# Altium footprint library WR-TBL_Rising Cage Clamp.PcbLib: 435 footprints (part 11 of 28)
Each footprint in its own frame and in the unit in brackets; x right, y up, seen from the top. Pads: shape width x height; smd on the part's side, far side on the other; paste and mask are expansions set on the pad; w line width, h text height; cw(c..) or ccw(c..) is an arc to the next point about the centre after c.
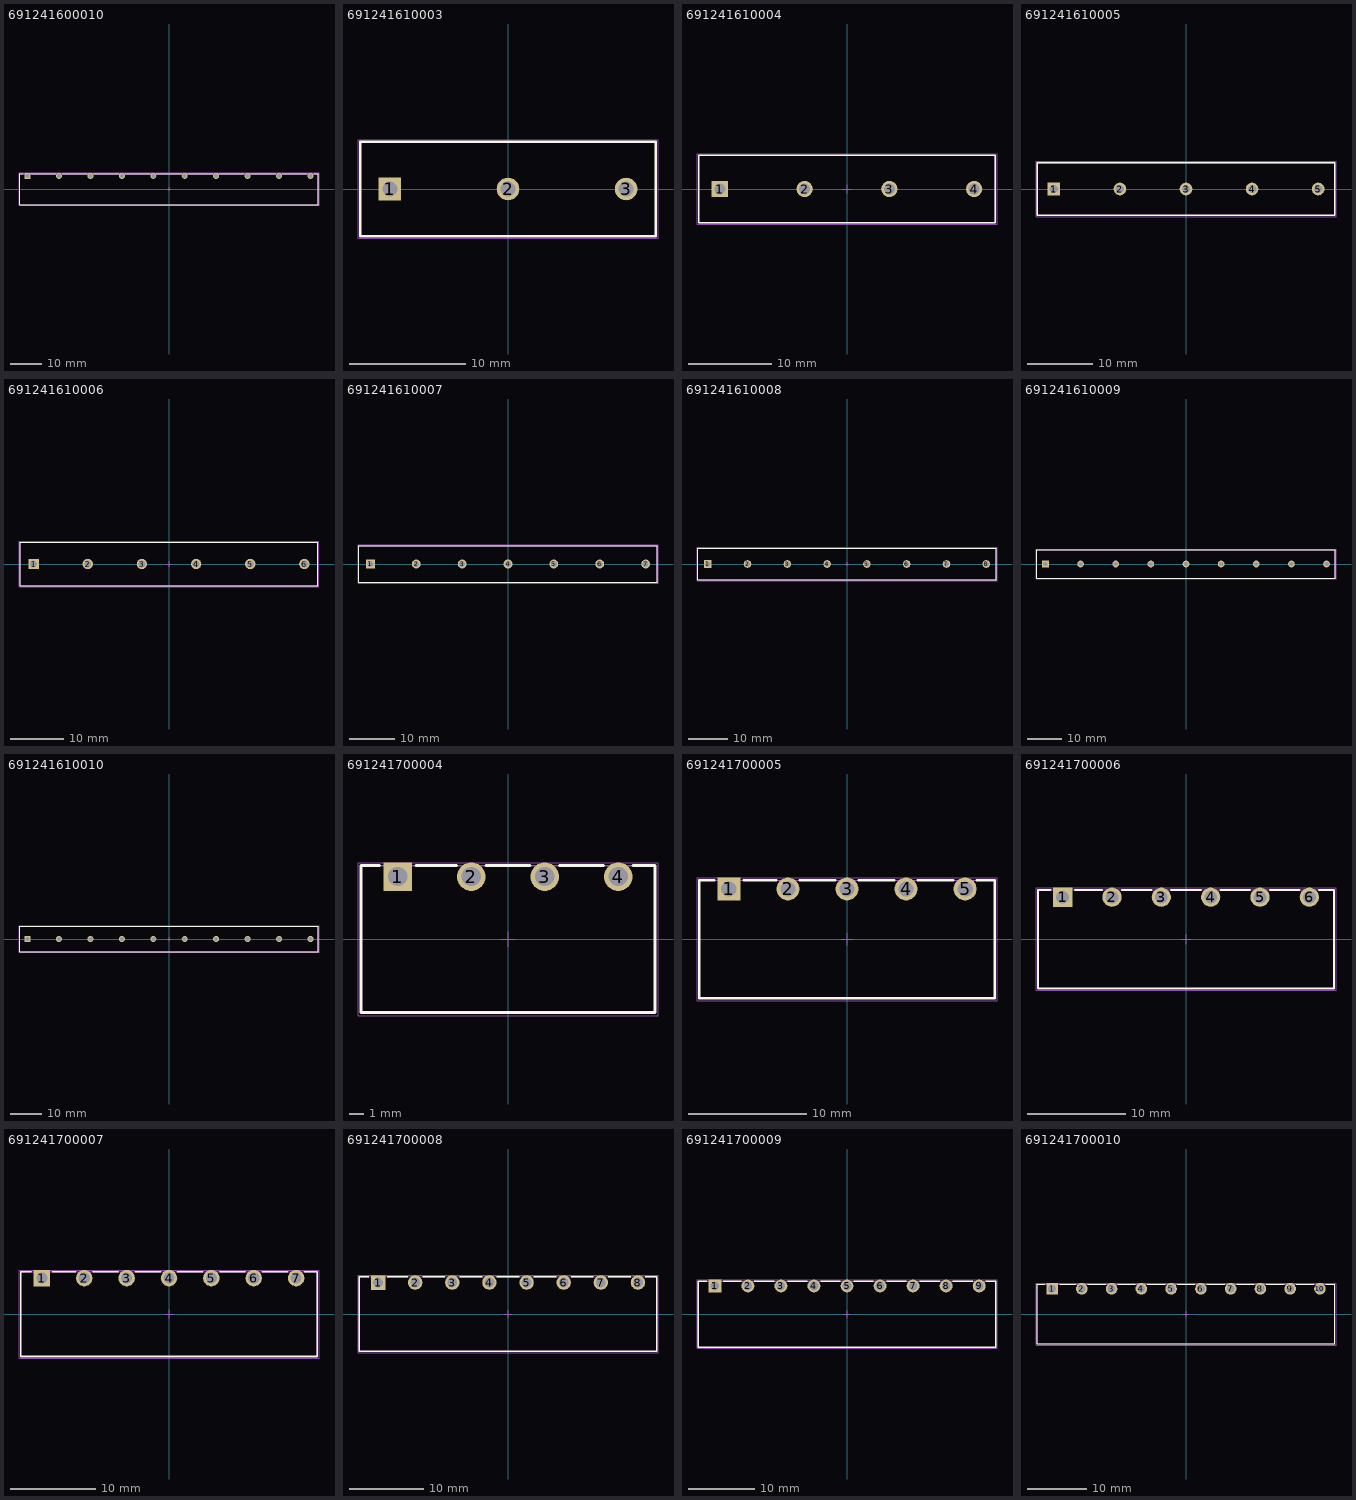
[diagram p10: the footprints below, top view; thin cyan lines are the x and y axes]

## 691241600010 [mm] "Vertical Cable Entry with Rising Cage Clamp, pitch 10.16mm, 10p"
height 8.1
pads (10):
  rect 1.95x1.95 hole 1.3: 1(-45.72,4.25)
  round 1.95 hole 1.3: 2(-35.56,4.25) 3(-25.4,4.25) 4(-15.24,4.25) 5(-5.08,4.25) 6(5.08,4.25) 7(15.24,4.25) 8(25.4,4.25) 9(35.56,4.25) 10(45.72,4.25)
Top Overlay:
  lines w0.2: -47.01,5 -48.26,5 -48.26,-5 48.26,-5 48.26,5 46.76,5 ; -44.46,5 -36.56,5 ; -34.56,5 -26.41,5 ; -24.4,5 -16.25,5 ; -14.24,5 -6.09,5 ; -4.08,5 4.07,5 ; 6.08,5 14.23,5 ; 16.24,5 24.39,5 ; 26.4,5 34.55,5 ; 36.56,5 44.71,5
Mechanical 13:
  lines w0.1: -48.26,-5 48.26,-5 48.26,5 -48.26,5 -48.26,-5
Mechanical 15:
  lines w0.05: -0.5,0 0.5,0 ; 0,-0.5 0,0.5 ; -48.46,-5.2 48.46,-5.2 48.46,5.2 -48.46,5.2 -48.46,-5.2
3D body "691241600010.stp": height 8.2, standoff -3.4, extent -48.26,-5 48.26,5

## 691241610003 [mm] "10.16mm Horizontal Cable Entry with Rising Cage Clamp, 03p"
height 10
pads (3):
  rect 1.95x1.95 hole 1.3: 1(-10.16,0)
  round 1.95 hole 1.3: 2(0,0) 3(10.16,0)
Top Overlay:
  lines w0.2: -12.7,-4.05 -12.7,4.05 12.7,4.05 12.7,-4.05 -12.7,-4.05
Mechanical 13:
  lines w0.1: -12.7,-4.05 12.7,-4.05 12.7,4.05 -12.7,4.05 -12.7,-4.05
Mechanical 15:
  lines w0.05: -0.5,0 0.5,0 ; 0,-0.5 0,0.5 ; -12.9,-4.25 12.9,-4.25 12.9,4.25 -12.9,4.25 -12.9,-4.25
3D body "691241610003.stp": height 10.1, standoff -3.4, extent -12.7,-4.05 12.7,4.05

## 691241610004 [mm] "10.16mm Horizontal Cable Entry with Rising Cage Clamp, 04p"
height 10
pads (4):
  rect 1.95x1.95 hole 1.3: 1(-15.24,0)
  round 1.95 hole 1.3: 2(-5.08,0) 3(5.08,0) 4(15.24,0)
Top Overlay:
  lines w0.2: -17.78,-4.05 -17.78,4.05 17.78,4.05 17.78,-4.05 -17.78,-4.05
Mechanical 13:
  lines w0.1: -17.78,-4.05 17.78,-4.05 17.78,4.05 -17.78,4.05 -17.78,-4.05
Mechanical 15:
  lines w0.05: -0.5,0 0.5,0 ; 0,-0.5 0,0.5 ; -17.98,-4.25 17.98,-4.25 17.98,4.25 -17.98,4.25 -17.98,-4.25
3D body "691241610004.stp": height 10.1, standoff -3.4, extent -17.78,-4.05 17.78,4.05

## 691241610005 [mm] "10.16mm Horizontal Cable Entry with Rising Cage Clamp, 05p"
height 10
pads (5):
  rect 1.95x1.95 hole 1.3: 1(-20.32,0)
  round 1.95 hole 1.3: 2(-10.16,0) 3(0,0) 4(10.16,0) 5(20.32,0)
Top Overlay:
  lines w0.2: -22.86,-4.05 -22.86,4.05 22.86,4.05 22.86,-4.05 -22.86,-4.05
Mechanical 13:
  lines w0.1: -22.86,-4.05 22.86,-4.05 22.86,4.05 -22.86,4.05 -22.86,-4.05
Mechanical 15:
  lines w0.05: -0.5,0 0.5,0 ; 0,-0.5 0,0.5 ; -23.06,-4.25 23.06,-4.25 23.06,4.25 -23.06,4.25 -23.06,-4.25
3D body "691241610005.stp": height 10.1, standoff -3.4, extent -22.86,-4.05 22.86,4.05

## 691241610006 [mm] "10.16mm Horizontal Cable Entry with Rising Cage Clamp, 06p"
height 10
pads (6):
  rect 1.95x1.95 hole 1.3: 1(-25.4,0)
  round 1.95 hole 1.3: 2(-15.24,0) 3(-5.08,0) 4(5.08,0) 5(15.24,0) 6(25.4,0)
Top Overlay:
  lines w0.2: -27.94,-4.05 27.94,-4.05 27.94,4.05 -27.94,4.05 -27.94,-4.05
Mechanical 13:
  lines w0.1: -27.94,-4.05 -27.94,4.05 27.94,4.05 27.94,-4.05 -27.94,-4.05
Mechanical 15:
  lines w0.05: -0.5,0 0.5,0 ; 0,-0.5 0,0.5 ; -28.14,-4.25 -28.14,4.25 28.14,4.25 28.14,-4.25 -28.14,-4.25
3D body "691241610006.stp": height 10.1, standoff -3.4, extent -27.94,-4.05 27.94,4.05

## 691241610007 [mm] "10.16mm Horizontal Cable Entry with Rising Cage Clamp, 07p"
height 10
pads (7):
  rect 1.95x1.95 hole 1.3: 1(-30.48,0)
  round 1.95 hole 1.3: 2(-20.32,0) 3(-10.16,0) 4(0,0) 5(10.16,0) 6(20.32,0) 7(30.48,0)
Top Overlay:
  lines w0.2: -33.02,-4.05 -33.02,4.05 33.02,4.05 33.02,-4.05 -33.02,-4.05
Mechanical 13:
  lines w0.1: -33.02,-4.05 33.02,-4.05 33.02,4.05 -33.02,4.05 -33.02,-4.05
Mechanical 15:
  lines w0.05: -0.5,0 0.5,0 ; 0,-0.5 0,0.5 ; -33.22,-4.25 33.22,-4.25 33.22,4.25 -33.22,4.25 -33.22,-4.25
3D body "691241610007.stp": height 10.1, standoff -3.4, extent -33.02,-4.05 33.02,4.05

## 691241610008 [mm] "10.16mm Horizontal Cable Entry with Rising Cage Clamp, 08p"
height 10
pads (8):
  rect 1.95x1.95 hole 1.3: 1(-35.56,0)
  round 1.95 hole 1.3: 2(-25.4,0) 3(-15.24,0) 4(-5.08,0) 5(5.08,0) 6(15.24,0) 7(25.4,0) 8(35.56,0)
Top Overlay:
  lines w0.2: -38.1,-4.05 -38.1,4.05 38.1,4.05 38.1,-4.05 -38.1,-4.05
Mechanical 13:
  lines w0.1: -38.1,-4.05 38.1,-4.05 38.1,4.05 -38.1,4.05 -38.1,-4.05
Mechanical 15:
  lines w0.05: -0.5,0 0.5,0 ; 0,-0.5 0,0.5 ; -38.3,-4.25 38.3,-4.25 38.3,4.25 -38.3,4.25 -38.3,-4.25
3D body "691241610008.stp": height 10.1, standoff -3.4, extent -38.1,-4.05 38.1,4.05

## 691241610009 [mm] "10.16mm Horizontal Cable Entry with Rising Cage Clamp, 09p"
height 10
pads (9):
  rect 1.95x1.95 hole 1.3: 1(-40.64,0)
  round 1.95 hole 1.3: 2(-30.48,0) 3(-20.32,0) 4(-10.16,0) 5(0,0) 6(10.16,0) 7(20.32,0) 8(30.48,0) 9(40.64,0)
Top Overlay:
  lines w0.2: -43.18,-4.05 -43.18,4.05 43.18,4.05 43.18,-4.05 -43.18,-4.05
Mechanical 13:
  lines w0.1: -43.18,-4.05 43.18,-4.05 43.18,4.05 -43.18,4.05 -43.18,-4.05
Mechanical 15:
  lines w0.05: -0.5,0 0.5,0 ; 0,-0.5 0,0.5 ; -43.38,-4.25 43.38,-4.25 43.38,4.25 -43.38,4.25 -43.38,-4.25
3D body "691241610009.stp": height 10.1, standoff -3.4, extent -43.18,-4.05 43.18,4.05

## 691241610010 [mm] "10.16mm Horizontal Cable Entry with Rising Cage Clamp, 10p"
height 10
pads (10):
  rect 1.95x1.95 hole 1.3: 1(-45.72,0)
  round 1.95 hole 1.3: 2(-35.56,0) 3(-25.4,0) 4(-15.24,0) 5(-5.08,0) 6(5.08,0) 7(15.24,0) 8(25.4,0) 9(35.56,0) 10(45.72,0)
Top Overlay:
  lines w0.2: -48.26,-4.05 -48.26,4.05 48.26,4.05 48.26,-4.05 -48.26,-4.05
Mechanical 13:
  lines w0.1: -48.26,-4.05 48.26,-4.05 48.26,4.05 -48.26,4.05 -48.26,-4.05
Mechanical 15:
  lines w0.05: -0.5,0 0.5,0 ; 0,-0.5 0,0.5 ; -48.46,-4.25 48.46,-4.25 48.46,4.25 -48.46,4.25 -48.46,-4.25
3D body "691241610010.stp": height 10.1, standoff -3.4, extent -48.26,-4.05 48.26,4.05

## 691241700004 [mm] "Serie 2417-5.00mm Vertical Cable Entry with Rising Cage Clamp, 4 pins"
height 8.1
pads (4):
  rect 1.95x1.95 hole 1.3: 1(-7.5,4.25)
  round 1.95 hole 1.3: 2(-2.5,4.25) 3(2.5,4.25) 4(7.5,4.25)
Top Overlay:
  lines w0.2: -8.75,5 -10,5 -10,-5 10,-5 10,5 8.5,5 ; -6.25,5 -3.5,5 ; -1.5,5 1.5,5 ; 3.5,5 6.5,5
Mechanical 13:
  lines w0.1: -10,-5 -10,5 10,5 10,-5 -10,-5
Mechanical 15:
  lines w0.05: -0.5,0 0.5,0 ; 0,-0.5 0,0.5 ; -10.2,-5.2 -10.2,5.2 10.2,5.2 10.2,-5.2 -10.2,-5.2
3D body "691241700004.stp": height 8.15, standoff -3.45, extent -10,-5 10,5

## 691241700005 [mm] "Serie 2417-5.00mm Vertical Cable Entry with Rising Cage Clamp, 5 pins"
height 8.1
pads (5):
  rect 1.95x1.95 hole 1.3: 1(-10,4.25)
  round 1.95 hole 1.3: 2(-5,4.25) 3(0,4.25) 4(5,4.25) 5(10,4.25)
Top Overlay:
  lines w0.2: -11.25,5 -12.5,5 -12.5,-5 12.5,-5 12.5,5 11,5 ; -8.75,5 -6,5 ; -4,5 -1,5 ; 1,5 4,5 ; 6,5 9,5
Mechanical 13:
  lines w0.1: -12.5,-5 -12.5,5 12.5,5 12.5,-5 -12.5,-5
Mechanical 15:
  lines w0.05: -0.5,0 0.5,0 ; 0,-0.5 0,0.5 ; -12.7,-5.2 -12.7,5.2 12.7,5.2 12.7,-5.2 -12.7,-5.2
3D body "691241700005.stp": height 8.15, standoff -3.45, extent -12.5,-5 12.5,5

## 691241700006 [mm] "Serie 2417-5.00mm Vertical Cable Entry with Rising Cage Clamp, 6 pins"
height 8.1
pads (6):
  rect 1.95x1.95 hole 1.3: 1(-12.5,4.25)
  round 1.95 hole 1.3: 2(-7.5,4.25) 3(-2.5,4.25) 4(2.5,4.25) 5(7.5,4.25) 6(12.5,4.25)
Top Overlay:
  lines w0.2: -13.75,5 -15,5 -15,-5 15,-5 15,5 13.5,5 ; -11.25,5 -8.5,5 ; -6.5,5 -3.5,5 ; -1.5,5 1.5,5 ; 3.5,5 6.5,5 ; 8.5,5 11.5,5
Mechanical 13:
  lines w0.1: -15,-5 15,-5 15,5 -15,5 -15,-5
Mechanical 15:
  lines w0.05: -0.5,0 0.5,0 ; 0,-0.5 0,0.5 ; -15.2,-5.2 15.2,-5.2 15.2,5.2 -15.2,5.2 -15.2,-5.2
3D body "691241700006.stp": height 8.15, standoff -3.45, extent -15,-5 15,5

## 691241700007 [mm] "Serie 2417-5.00mm Vertical Cable Entry with Rising Cage Clamp, 7 pins"
height 8.1
pads (7):
  rect 1.95x1.95 hole 1.3: 1(-15,4.25)
  round 1.95 hole 1.3: 2(-10,4.25) 3(-5,4.25) 4(0,4.25) 5(5,4.25) 6(10,4.25) 7(15,4.25)
Top Overlay:
  lines w0.2: -16.25,5 -17.5,5 -17.5,-5 17.5,-5 17.5,5 16,5 ; -13.75,5 -11,5 ; -9,5 -6,5 ; -4,5 -1,5 ; 1,5 4,5 ; 6,5 9,5 ; 11,5 14,5
Mechanical 13:
  lines w0.1: -17.5,-5 17.5,-5 17.5,5 -17.5,5 -17.5,-5
Mechanical 15:
  lines w0.05: -0.5,0 0.5,0 ; 0,-0.5 0,0.5 ; -17.7,-5.2 17.7,-5.2 17.7,5.2 -17.7,5.2 -17.7,-5.2
3D body "691241700007.stp": height 8.15, standoff -3.45, extent -17.5,-5 17.5,5

## 691241700008 [mm] "Serie 2417-5.00mm Vertical Cable Entry with Rising Cage Clamp, 8 pins"
height 8.1
pads (8):
  rect 1.95x1.95 hole 1.3: 1(-17.5,4.25)
  round 1.95 hole 1.3: 2(-12.5,4.25) 3(-7.5,4.25) 4(-2.5,4.25) 5(2.5,4.25) 6(7.5,4.25) 7(12.5,4.25) 8(17.5,4.25)
Top Overlay:
  lines w0.2: -18.75,5 -20,5 -20,-5 20,-5 20,5 18.5,5 ; -16.25,5 -13.5,5 ; -11.5,5 -8.5,5 ; -6.5,5 -3.5,5 ; -1.5,5 1.5,5 ; 3.5,5 6.5,5 ; 8.5,5 11.5,5 ; 13.5,5 16.5,5
Mechanical 13:
  lines w0.1: -20,-5 -20,5 20,5 20,-5 -20,-5
Mechanical 15:
  lines w0.05: -0.5,0 0.5,0 ; 0,-0.5 0,0.5 ; -20.2,-5.2 -20.2,5.2 20.2,5.2 20.2,-5.2 -20.2,-5.2
3D body "691241700008.stp": height 8.15, standoff -3.45, extent -20,-5 20,5

## 691241700009 [mm] "Serie 2417-5.00mm Vertical Cable Entry with Rising Cage Clamp, 9 pins"
height 8.1
pads (9):
  rect 1.95x1.95 hole 1.3: 1(-20,4.25)
  round 1.95 hole 1.3: 2(-15,4.25) 3(-10,4.25) 4(-5,4.25) 5(0,4.25) 6(5,4.25) 7(10,4.25) 8(15,4.25) 9(20,4.25)
Top Overlay:
  lines w0.2: -21.25,5 -22.5,5 -22.5,-5 22.5,-5 22.5,5 21,5 ; -18.75,5 -16,5 ; -14,5 -11,5 ; -9,5 -6,5 ; -4,5 -1,5 ; 1,5 4,5 ; 6,5 9,5 ; 11,5 14,5 ; 16,5 19,5
Mechanical 13:
  lines w0.1: -22.5,-5 22.5,-5 22.5,5 -22.5,5 -22.5,-5
Mechanical 15:
  lines w0.05: -0.5,0 0.5,0 ; 0,-0.5 0,0.5 ; -22.7,-5.2 22.7,-5.2 22.7,5.2 -22.7,5.2 -22.7,-5.2
3D body "691241700009.stp": height 8.15, standoff -3.45, extent -22.5,-5 22.5,5

## 691241700010 [mm] "Serie 2417-5.00mm Vertical Cable Entry with Rising Cage Clamp, 10 pins"
height 8.1
pads (10):
  rect 1.95x1.95 hole 1.3: 1(-22.5,4.25)
  round 1.95 hole 1.3: 2(-17.5,4.25) 3(-12.5,4.25) 4(-7.5,4.25) 5(-2.5,4.25) 6(2.5,4.25) 7(7.5,4.25) 8(12.5,4.25) 9(17.5,4.25) 10(22.5,4.25)
Top Overlay:
  lines w0.2: -23.75,5 -25,5 -25,-5 25,-5 25,5 23.5,5 ; -21.25,5 -18.5,5 ; -16.5,5 -13.5,5 ; -11.5,5 -8.5,5 ; -6.5,5 -3.5,5 ; -1.5,5 1.5,5 ; 3.5,5 6.5,5 ; 8.5,5 11.5,5 ; 13.5,5 16.5,5 ; 18.5,5 21.5,5
Mechanical 13:
  lines w0.1: -25,-5 -25,5 25,5 25,-5 -25,-5
Mechanical 15:
  lines w0.05: -0.5,0 0.5,0 ; 0,-0.5 0,0.5 ; -25.2,-5.2 -25.2,5.2 25.2,5.2 25.2,-5.2 -25.2,-5.2
3D body "691241700010.stp": height 8.15, standoff -3.45, extent -25,-5 25,5